# Altium footprint library XU-GENARAL PCB .PcbLib: 1176 footprints (part 59 of 75)
Each footprint in its own frame and in the unit in brackets; x right, y up, seen from the top. Pads: shape width x height; smd on the part's side, far side on the other; paste and mask are expansions set on the pad; w line width, h text height; cw(c..) or ccw(c..) is an arc to the next point about the centre after c.
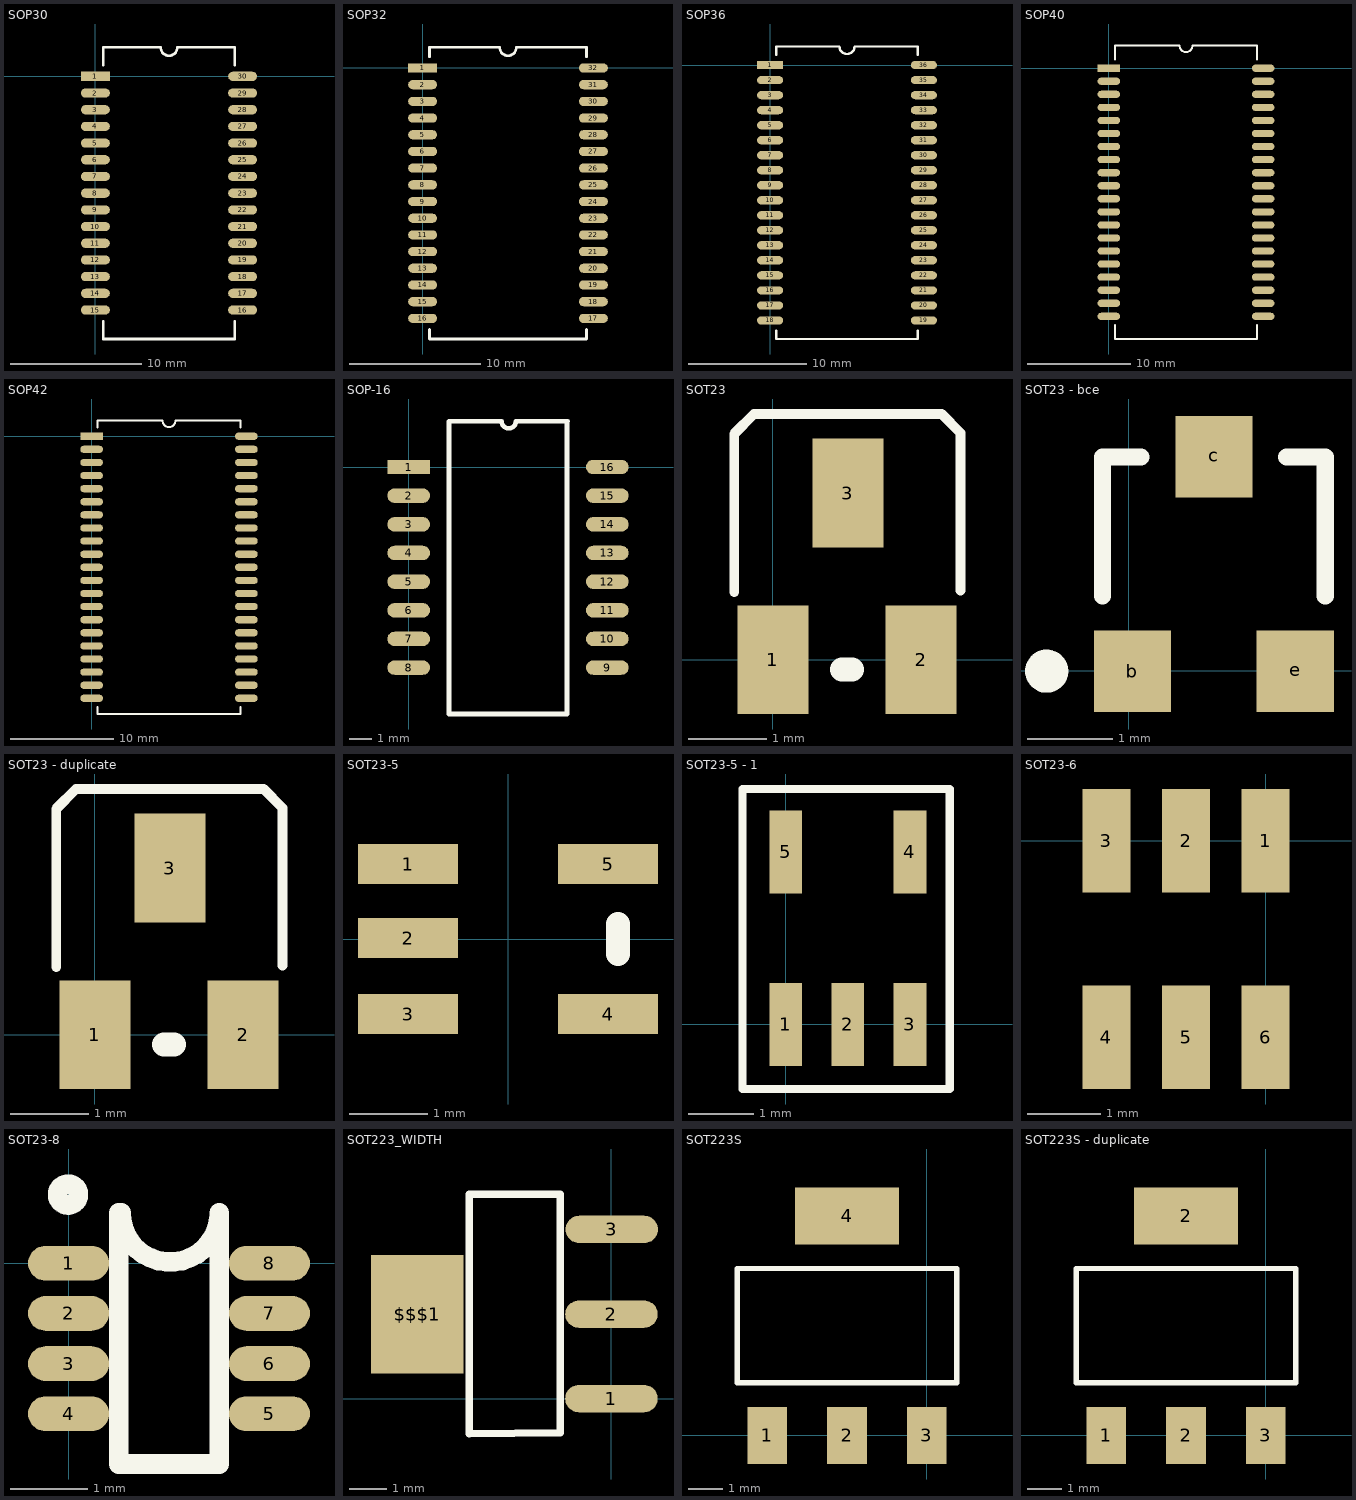
[diagram p58: the footprints below, top view; thin cyan lines are the x and y axes]

## SOP30 [mm]
pads (30):
  rect 2.2x0.7 smd: 1(0,0)
  oval 2.2x0.7 smd: 2(0,-1.27) 3(0,-2.54) 4(0,-3.81) 5(0,-5.08) 6(0,-6.35) 7(0,-7.62) 8(0,-8.89) 9(0,-10.16) 10(0,-11.43) 11(0,-12.7) 12(0,-13.97) 13(0,-15.24) 14(0,-16.51) 15(0,-17.78) 16(11.2,-17.78) 17(11.2,-16.51) 18(11.2,-15.24) 19(11.2,-13.97) 20(11.2,-12.7) 21(11.2,-11.43) 22(11.2,-10.16) 23(11.2,-8.89) 24(11.2,-7.62) 25(11.2,-6.35) 26(11.2,-5.08) 27(11.2,-3.81) 28(11.2,-2.54) 29(11.2,-1.27) 30(11.2,0)
Top Overlay:
  lines w0.2: 0.585,-18.63 0.585,-19.985 10.615,-19.985 10.615,-18.63 ; 0.585,0.85 0.585,2.205 4.965,2.205 ccw(c5.6,2.205) 6.235,2.205 10.615,2.205 10.615,0.85

## SOP32 [mm]
pads (32):
  rect 2.2x0.7 smd: 1(0,0)
  oval 2.2x0.7 smd: 2(0,-1.27) 3(0,-2.54) 4(0,-3.81) 5(0,-5.08) 6(0,-6.35) 7(0,-7.62) 8(0,-8.89) 9(0,-10.16) 10(0,-11.43) 11(0,-12.7) 12(0,-13.97) 13(0,-15.24) 14(0,-16.51) 15(0,-17.78) 16(0,-19.05) 17(13,-19.05) 18(13,-17.78) 19(13,-16.51) 20(13,-15.24) 21(13,-13.97) 22(13,-12.7) 23(13,-11.43) 24(13,-10.16) 25(13,-8.89) 26(13,-7.62) 27(13,-6.35) 28(13,-5.08) 29(13,-3.81) 30(13,-2.54) 31(13,-1.27) 32(13,0)
Top Overlay:
  lines w0.2: 0.53,-19.9 0.53,-20.62 12.47,-20.62 12.47,-19.9 ; 0.53,0.85 0.53,1.57 5.865,1.57 ccw(c6.5,1.57) 7.135,1.57 12.47,1.57 12.47,0.85

## SOP36 [mm]
pads (36):
  rect 2.2x0.7 smd: 1(0,0)
  oval 2.2x0.7 smd: 2(0,-1.27) 3(0,-2.54) 4(0,-3.81) 5(0,-5.08) 6(0,-6.35) 7(0,-7.62) 8(0,-8.89) 9(0,-10.16) 10(0,-11.43) 11(0,-12.7) 12(0,-13.97) 13(0,-15.24) 14(0,-16.51) 15(0,-17.78) 16(0,-19.05) 17(0,-20.32) 18(0,-21.59) 19(13,-21.59) 20(13,-20.32) 21(13,-19.05) 22(13,-17.78) 23(13,-16.51) 24(13,-15.24) 25(13,-13.97) 26(13,-12.7) 27(13,-11.43) 28(13,-10.16) 29(13,-8.89) 30(13,-7.62) 31(13,-6.35) 32(13,-5.08) 33(13,-3.81) 34(13,-2.54) 35(13,-1.27) 36(13,0)
Top Overlay:
  lines w0.2: 0.53,-22.44 0.53,-23.16 12.47,-23.16 12.47,-22.44 ; 0.53,0.85 0.53,1.57 5.865,1.57 ccw(c6.5,1.57) 7.135,1.57 12.47,1.57 12.47,0.85

## SOP40 [mm]
pads (40):
  rect 2.2x0.7 smd: 1(0,0)
  oval 2.2x0.7 smd: 2(0,-1.27) 3(0,-2.54) 4(0,-3.81) 5(0,-5.08) 6(0,-6.35) 7(0,-7.62) 8(0,-8.89) 9(0,-10.16) 10(0,-11.43) 11(0,-12.7) 12(0,-13.97) 13(0,-15.24) 14(0,-16.51) 15(0,-17.78) 16(0,-19.05) 17(0,-20.32) 18(0,-21.59) 19(0,-22.86) 20(0,-24.13) 21(15,-24.13) 22(15,-22.86) 23(15,-21.59) 24(15,-20.32) 25(15,-19.05) 26(15,-17.78) 27(15,-16.51) 28(15,-15.24) 29(15,-13.97) 30(15,-12.7) 31(15,-11.43) 32(15,-10.16) 33(15,-8.89) 34(15,-7.62) 35(15,-6.35) 36(15,-5.08) 37(15,-3.81) 38(15,-2.54) 39(15,-1.27) 40(15,0)
Top Overlay:
  lines w0.2: 0.58,-24.98 0.58,-26.335 14.42,-26.335 14.42,-24.98 ; 0.58,0.85 0.58,2.205 6.865,2.205 ccw(c7.5,2.205) 8.135,2.205 14.42,2.205 14.42,0.85

## SOP42 [mm]
pads (42):
  rect 2.2x0.7 smd: 1(0,0)
  oval 2.2x0.7 smd: 2(0,-1.27) 3(0,-2.54) 4(0,-3.81) 5(0,-5.08) 6(0,-6.35) 7(0,-7.62) 8(0,-8.89) 9(0,-10.16) 10(0,-11.43) 11(0,-12.7) 12(0,-13.97) 13(0,-15.24) 14(0,-16.51) 15(0,-17.78) 16(0,-19.05) 17(0,-20.32) 18(0,-21.59) 19(0,-22.86) 20(0,-24.13) 21(0,-25.4) 22(15,-25.4) 23(15,-24.13) 24(15,-22.86) 25(15,-21.59) 26(15,-20.32) 27(15,-19.05) 28(15,-17.78) 29(15,-16.51) 30(15,-15.24) 31(15,-13.97) 32(15,-12.7) 33(15,-11.43) 34(15,-10.16) 35(15,-8.89) 36(15,-7.62) 37(15,-6.35) 38(15,-5.08) 39(15,-3.81) 40(15,-2.54) 41(15,-1.27) 42(15,0)
Top Overlay:
  lines w0.2: 0.58,-26.25 0.58,-26.92 14.42,-26.92 14.42,-26.25 ; 0.58,0.85 0.58,1.52 6.865,1.52 ccw(c7.5,1.52) 8.135,1.52 14.42,1.52 14.42,0.85

## SOP-16 [mm]
pads (16):
  rect 1.9x0.64 smd: 1(0,0)
  oval 1.9x0.64 smd: 2(0,-1.27) 3(0,-2.54) 4(0,-3.81) 5(0,-5.08) 6(0,-6.35) 7(0,-7.62) 8(0,-8.89) 9(8.8,-8.89) 10(8.8,-7.62) 11(8.8,-6.35) 12(8.8,-5.08) 13(8.8,-3.81) 14(8.8,-2.54) 15(8.8,-1.27) 16(8.8,0)
Top Overlay:
  lines w0.2: 1.785,-10.947 1.785,2.032 ; 1.806,-10.947 7.036,-10.947 ; 1.817,2.032 4.115,2.032 ccw(c4.432,2.032) 4.75,2.032 7.047,2.032 ; 7.015,-10.947 7.015,2.032

## SOT23 [mil]
pads (3):
  rect 36x55 smd: 1(0,0) 2(75,0) 3(38,84.31)
Top Overlay:
  lines w5: -19.58,34.31 -19.58,114.31 -9.58,124.31 85.42,124.31 95,114.73 95,35
  lines w12: 35,-5 40,-5

## SOT23 - bce [mm]
height 1.1
pads (3):
  rect 0.9x0.95 smd: b(0.041,-0.005) c(0.991,2.495) e(1.941,-0.005)
Top Overlay:
  circle w0.254: c-0.959,-0.005 r0.125
  lines w0.2: -0.309,0.87 -0.309,2.495 0.141,2.495 ; 1.841,2.495 2.291,2.495 2.291,0.87

## SOT23 - duplicate [mil]
pads (3):
  rect 36x55 smd: 1(0,0) 2(75,0) 3(38,84.31)
Top Overlay:
  lines w5: -19.58,34.31 -19.58,114.31 -9.58,124.31 85.42,124.31 95,114.73 95,35
  lines w12: 35,-5 40,-5

## SOT23-5 [mil]
pads (5):
  rect 50x20 smd: 1(-50,37.5) 2(-50,0.5) 3(-50,-37.5) 4(50,-37.5) 5(50,37.5)
Top Overlay:
  lines w12: 55,-7.5 55,7.5

## SOT23-5 - 1 [mm]
pads (5):
  rect 0.5x1.27 smd: 1(0,0) 2(0.95,0) 3(1.905,0) 4(1.905,2.642) 5(0,2.642)
Top Overlay:
  lines w0.127: -0.66,-0.991 2.515,-0.991 2.515,3.607 -0.66,3.607 -0.66,-0.991

## SOT23-6 [mil]
pads (6):
  rect 26x56 smd: 1(0,0) 2(-43,0) 3(-86,0) 4(-86,-106) 5(-43,-106) 6(0,-106)

## SOT23-8 [mm]
height 1.1
pads (8):
  oval 1.05x0.45 smd: 1(0,0) 2(0,-0.65) 3(0,-1.3) 4(0,-1.95) 5(2.6,-1.95) 6(2.6,-1.3) 7(2.6,-0.65) 8(2.6,0)
Top Overlay:
  circle w0.254: c-0.008,0.889 r0.135
  lines w0.254: 0.65,0.65 0.65,-2.6 1.95,-2.6 1.95,0.65 cw(c1.315,0.65) 0.68,0.65

## SOT223_WIDTH [mm]
pads (4):
  oval 2.5x0.74 smd: 1(0,0) 2(0,2.282) 3(0.008,4.572)
  rect 2.5x3.2 smd: $$$1(-5.25,2.282)
Top Overlay:
  lines w0.2: -3.849,-0.947 -1.385,-0.925 -1.385,5.517 -3.849,5.523 -3.849,-0.947

## SOT223S [mil]
pads (4):
  rect 45x65 smd: 1(-182,0) 2(-91,0) 3(0,0)
  rect 118x65 smd: 4(-91,250)
Top Overlay:
  lines w5.91: -216,60 -216,190 34,190 34,60 -216,60

## SOT223S - duplicate [mil]
pads (4):
  rect 45x65 smd: 1(-182,0) 2(-91,0) 3(0,0)
  rect 118x65 smd: 2(-91,250)
Top Overlay:
  lines w5.91: -216,60 -216,190 34,190 34,60 -216,60